# Altium footprint library Connectors.PcbLib: 164 footprints (part 9 of 11)
Each footprint in its own frame and in the unit in brackets; x right, y up, seen from the top. Pads: shape width x height; smd on the part's side, far side on the other; paste and mask are expansions set on the pad; w line width, h text height; cw(c..) or ccw(c..) is an arc to the next point about the centre after c.
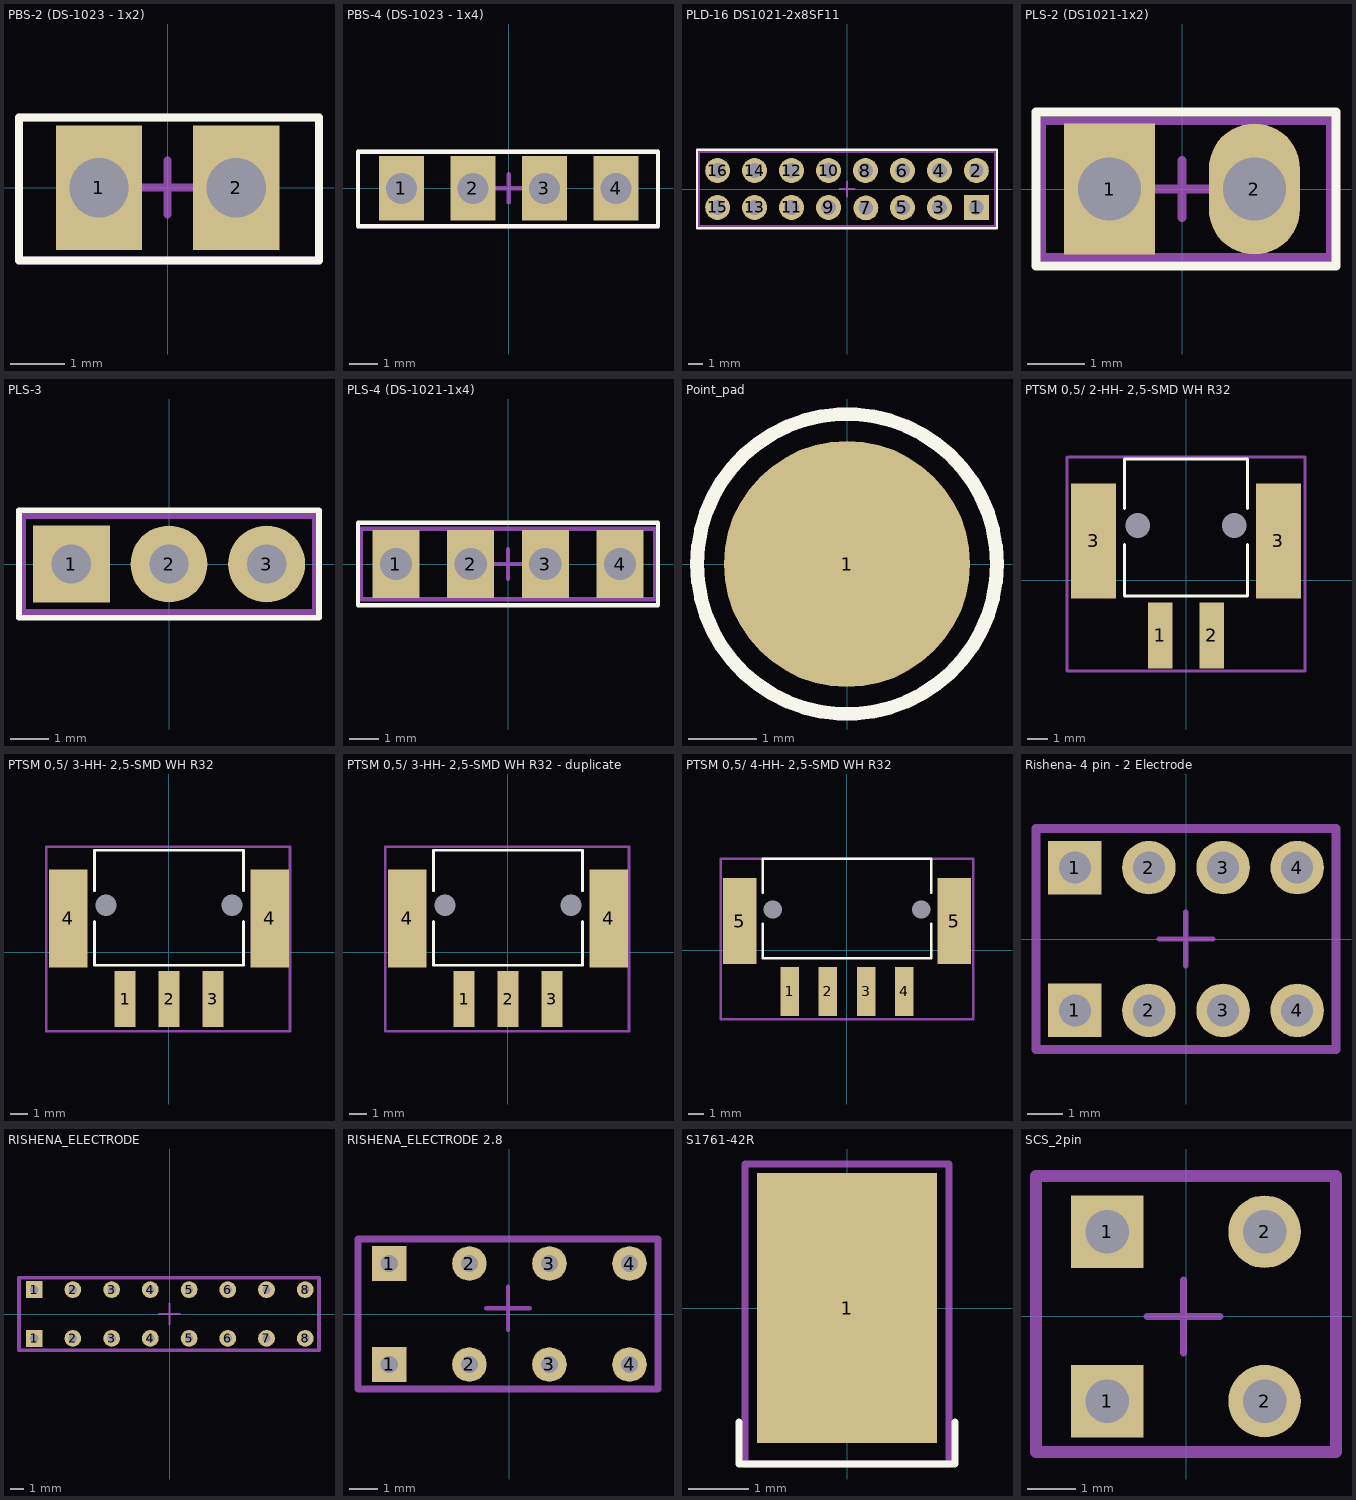
[diagram p8: the footprints below, top view; thin cyan lines are the x and y axes]

## PBS-2 (DS-1023 - 1x2) [mm] "2 point header"
pads (2):
  rect 1.6x2.3 hole 1.1: 1(-1.27,0) 2(1.27,0)
Top Overlay:
  lines w0.15: -2.75,-1.35 -2.75,1.3 2.8,1.3 2.8,-1.35 -2.75,-1.35
Mechanical 13:
  lines w0.15: -0.5,0 0.5,0 ; 0,-0.5 0,0.5 ; -2.75,-1.35 2.8,-1.35 2.8,1.3 -2.75,1.3 -2.75,-1.35
3D body "User Library-PBS_(DS1023)_1line_connectors_h=5_0_8_5mm_step_2_54mm-1 (1).step": height 8.5, standoff -3, extent -2.79,-1.25 2.79,1.25

## PBS-4 (DS-1023 - 1x4) [mm] "4 point header"
pads (4):
  rect 1.6x2.3 hole 1.1: 1(-3.81,0) 2(-1.27,0) 3(1.27,0) 4(3.81,0)
Top Overlay:
  lines w0.15: -5.35,-1.35 -5.35,1.3 5.3,1.3 5.3,-1.35 -5.35,-1.35
Mechanical 13:
  lines w0.15: -0.5,0 0.5,0 ; 0,-0.5 0,0.5 ; -5.35,-1.35 5.3,-1.35 5.3,1.3 -5.35,1.3 -5.35,-1.35
3D body "User Library-PBS_(DS1023)_1line_connectors_h=5_0_8_5mm_step_2_54mm-1.step": height 8.5, standoff -3, extent -5.33,-1.25 5.33,1.25

## PLD-16 DS1021-2x8SF11 [mm]
pads (16):
  rect 1.7x1.7 hole 1: 1(8.89,-1.27)
  round 1.7 hole 1: 2(8.89,1.27) 3(6.35,-1.27) 4(6.35,1.27) 5(3.81,-1.27) 6(3.81,1.27) 7(1.3,-1.3) 8(1.27,1.27) 9(-1.27,-1.27) 10(-1.27,1.27) 11(-3.81,-1.27) 12(-3.81,1.27) 13(-6.35,-1.27) 14(-6.35,1.27) 15(-8.89,-1.27) 16(-8.89,1.27)
Top Overlay:
  lines w0.15: -10.3,-2.7 -10.3,2.7 10.3,2.7 10.3,-2.7 -10.3,-2.7
Mechanical 15:
  lines w0.15: -0.5,0 0.5,0 ; 0,-0.5 0,0.5 ; -10.16,-2.54 10.16,-2.54 10.16,2.54 -10.16,2.54 -10.16,-2.54
3D body "User Library-DS1021_Male.step": height 8.54, standoff -2.96, extent -10.16,-2.55 10.16,2.53

## PLS-2 (DS1021-1x2) [mm] "2 point header"
pads (2):
  rect 1.6x2.3 hole 1.1: 1(-1.27,0)
  oval 1.6x2.3 hole 1.1: 2(1.27,0)
Top Overlay:
  lines w0.15: -2.56,-1.35 2.7,-1.35 2.7,1.35 -2.56,1.35 -2.56,-1.35
Mechanical 13:
  lines w0.15: -0.5,0 0.5,0 ; 0,-0.5 0,0.5 ; -2.46,-1.2 -2.46,1.2 2.6,1.2 2.6,-1.2 -2.46,-1.2
3D body "User Library-PLS-2-1.STEP": height 7.83, standoff -2.97, extent -2.48,-1.27 2.6,1.27

## PLS-3 [mm]
pads (3):
  rect 2x2 hole 1.02 mask+0.07: 1(-2.54,0)
  round 2 hole 1.02 mask+0.07: 2(0,0) 3(2.54,0)
Top Overlay:
  lines w0.15: -3.9,-1.4 -3.9,1.4 3.9,1.4 3.9,-1.4 -3.9,-1.4
Mechanical 15:
  lines w0.15: -0.5,0 0.5,0 ; 0,-0.5 0,0.5 ; -3.79,-1.25 3.79,-1.25 3.79,1.25 -3.79,1.25 -3.79,-1.25
3D body "User Library-PLS-03.step": height 8, standoff -3.3, extent -3.81,-1.25 3.81,1.25

## PLS-4 (DS-1021-1x4) [mm] "4 point header"
pads (4):
  rect 1.6x2.3 hole 1.1: 1(-3.81,0) 2(-1.27,0) 3(1.27,0) 4(3.81,0)
Top Overlay:
  lines w0.15: -5.1,-1.4 5.1,-1.4 5.1,1.4 -5.1,1.4 -5.1,-1.4
Mechanical 13:
  lines w0.15: -0.5,0 0.5,0 ; 0,-0.5 0,0.5 ; -5,-1.2 -5,1.2 5,1.2 5,-1.2 -5,-1.2
3D body "User Library-1x4 TH Pitch 2_54mm.STEP": height 9.2, standoff -3.5, extent -5.08,-1.27 5.08,1.27

## Point_pad [mm]
pads (1):
  round 3.6 smd: 1(0,0)
Top Overlay:
  circle w0.2: c0,0 r2.193
Mechanical 3:
  lines w0.1: -0.5,0 0.5,0 ; 0,-0.5 0,0.5
3D body "s70-332002045.stp": height 0.2, standoff 0, extent -1.6,-1.6 1.6,1.6

## PTSM 0,5/ 2-HH- 2,5-SMD WH R32 [mm]
height 6
pads (6):
  rect 1.2x3.2 smd: 1(-1.25,-2.675) 2(1.25,-2.675)
  rect 2.2x5.6 smd: 3(-4.5,1.925) 3(4.5,1.925)
  round 0 hole 1.2 unplated: NC(-2.35,2.675) NC(2.35,2.675)
Top Overlay:
  lines w0.15: -3,1.75 -3,-0.75 3,-0.75 3,1.75 ; -3,3.5 -3,5.9 3,5.9 3,3.5
Mechanical 15:
  lines w0.15: -5.8,6 -5.8,-4.4 5.8,-4.4 5.8,6 -5.7,6
3D body "1808190.stp": height 5, standoff 0, extent -5.3,-3.6 5.3,5.9

## PTSM 0,5/ 3-HH- 2,5-SMD WH R32 [mm]
height 6
pads (7):
  rect 1.2x3.2 smd: 1(-2.5,-2.675) 2(0,-2.675) 3(2.5,-2.675)
  rect 2.2x5.6 smd: 4(-5.75,1.925) 4(5.75,1.925)
  round 0 hole 1.2 unplated: NC(-3.6,2.675) NC(3.6,2.675)
Top Overlay:
  lines w0.15: -4.25,1.75 -4.25,-0.75 4.25,-0.75 4.25,1.75 ; -4.25,3.5 -4.25,5.8 4.25,5.8 4.25,3.5
Mechanical 15:
  lines w0.15: -7,-4.5 -7,6 6.9,6 6.9,-4.5 -7,-4.5
3D body "1808200.stp": height 5, standoff 0, extent -6.55,-3.6 6.55,5.9

## PTSM 0,5/ 3-HH- 2,5-SMD WH R32 - duplicate [mm]
height 6
pads (7):
  rect 1.2x3.2 smd: 1(-2.5,-2.675) 2(0,-2.675) 3(2.5,-2.675)
  rect 2.2x5.6 smd: 4(-5.75,1.925) 4(5.75,1.925)
  round 0 hole 1.2 unplated: NC(-3.6,2.675) NC(3.6,2.675)
Top Overlay:
  lines w0.15: -4.25,1.75 -4.25,-0.75 4.25,-0.75 4.25,1.75 ; -4.25,3.5 -4.25,5.8 4.25,5.8 4.25,3.5
Mechanical 15:
  lines w0.15: -7,-4.5 -7,6 6.9,6 6.9,-4.5 -7,-4.5
3D body "1808200.stp": height 5, standoff 0, extent -6.55,-3.6 6.55,5.9

## PTSM 0,5/ 4-HH- 2,5-SMD WH R32 [mm]
height 6
pads (8):
  rect 1.2x3.2 smd: 1(-3.75,-2.675) 2(-1.25,-2.675) 3(1.25,-2.675) 4(3.75,-2.675)
  rect 2.2x5.6 smd: 5(-7,1.925) 5(7,1.925)
  round 0 hole 1.2 unplated: NC(-4.85,2.675) NC(4.85,2.675)
Top Overlay:
  lines w0.15: -5.5,1.75 -5.5,-0.5 5.5,-0.5 5.5,1.75 ; -5.5,3.75 -5.5,6 5.5,6 5.5,3.75
Mechanical 15:
  lines w0.15: -8.25,-4.5 -8.25,6 8.25,6 8.25,-4.5 -8.25,-4.5
3D body "1808213.stp": height 5, standoff 0, extent -7.8,-3.6 7.8,5.9

## Rishena- 4 pin - 2 Electrode [mm] "Rishena 4 pin -2 connector implanted  electrode,"
height 5
pads (8):
  rect 1.5x1.5 hole 0.9: 1(-3.112,-2) 1(-3.112,2)
  round 1.5 hole 0.9: 2(-1.037,-2) 2(-1.037,2) 3(1.037,-2) 3(1.037,2) 4(3.112,-2) 4(3.112,2)
Mechanical 15:
  lines w0.15: -0.748,0 0.753,0 ; -0.002,-0.75 -0.002,0.75
  lines w0.254: -4.2,-3.1 4.2,-3.1 4.2,3.1 -4.2,3.1 -4.2,-3.1
3D body "Header.step": height 5.1, standoff 0, extent 2.962,-1.95 3.262,1.95
3D body "Header.step": height 5.1, standoff 0, extent 0.887,-1.95 1.187,1.95
3D body "Header.step": height 5.1, standoff 0, extent -3.262,-1.95 -2.962,1.95
3D body "Header.step": height 5.1, standoff 0, extent -1.188,-1.95 -0.888,1.95

## RISHENA_ELECTRODE [mm] "Rishena  8pin connector implanted  electrode"
height 5
pads (16):
  rect 1.2x1.2 hole 0.6: 1(-9.712,-1.75) 1(-9.712,1.75)
  round 1.2 hole 0.6: 2(-6.937,-1.75) 2(-6.937,1.75) 3(-4.162,-1.75) 3(-4.162,1.75) 4(-1.387,-1.75) 4(-1.387,1.75) 5(1.387,-1.75) 5(1.387,1.75) 6(4.162,-1.75) 6(4.162,1.75) 7(6.937,-1.75) 7(6.937,1.75) 8(9.712,-1.75) 8(9.712,1.75)
Mechanical 15:
  lines w0.15: -0.75,0 0.75,0 ; 0,-0.75 0,0.75
  lines w0.254: -10.8,-2.6 -10.8,2.6 10.7,2.6 10.7,-2.6 -10.8,-2.6
3D body "Header.step": height 4.1, standoff -1, extent -7.096,-1.9 -6.796,2
3D body "Header.step": height 4.1, standoff -1, extent 9.554,-1.9 9.854,2
3D body "Header.step": height 4.1, standoff -1, extent 6.779,-1.9 7.079,2
3D body "Header.step": height 4.1, standoff -1, extent 4.004,-1.9 4.304,2
3D body "Header.step": height 4.1, standoff -1, extent 1.229,-1.9 1.529,2
3D body "Header.step": height 4.1, standoff -1, extent -1.546,-1.9 -1.246,2
3D body "Header.step": height 4.1, standoff -1, extent -4.321,-1.9 -4.021,2
3D body "Header.step": height 4.1, standoff -1, extent -9.862,-1.9 -9.562,2

## RISHENA_ELECTRODE 2.8 [mm] "Rishena  4pin connector implanted  electrode"
height 5
pads (8):
  rect 1.2x1.2 hole 0.6: 1(-4.162,-1.75) 1(-4.162,1.75)
  round 1.2 hole 0.6: 2(-1.387,-1.75) 2(-1.387,1.75) 3(1.388,-1.75) 3(1.388,1.75) 4(4.162,-1.75) 4(4.162,1.75)
Mechanical 15:
  lines w0.15: -0.8,0.2 0.7,0.2 ; -0.05,-0.55 -0.05,0.95
  lines w0.254: -5.25,-2.6 -5.25,2.6 5.15,2.6 5.15,-2.6 -5.25,-2.6
3D body "Header.step": height 4.1, standoff -1, extent -1.546,-1.9 -1.246,2
3D body "Header.step": height 4.1, standoff -1, extent 4.004,-1.9 4.304,2
3D body "Header.step": height 4.1, standoff -1, extent 1.229,-1.9 1.529,2
3D body "Header.step": height 4.1, standoff -1, extent -4.312,-1.9 -4.012,2

## S1761-42R [mm] "3.50mm SMT Spring Contact"
pads (1):
  rect 3x4.5 smd: 1(0,0)
Top Overlay:
  lines w0.11: -1.8,-1.9 -1.8,-2.6 1.8,-2.6 1.8,-1.9
Mechanical 13:
  lines w0.11: -1,0 1,0 ; 0,-1 0,1 ; -1.7,-2.6 -1.7,2.4 1.7,2.4 1.7,-2.6 -1.7,-2.6
3D body "s1761-42r.stp": height 3.51, standoff -0.01, extent -1.25,-2.5 1.25,1.999

## SCS_2pin [mm] "Rishena 302D 8pin connector implanted  electrode"
height 5
pads (4):
  rect 1.5x1.5 hole 0.9: 1(-1.625,-1.75) 1(-1.625,1.75)
  round 1.5 hole 0.9: 2(1.625,-1.75) 2(1.625,1.75)
Mechanical 15:
  lines w0.15: -0.8,0 0.7,0 ; -0.05,-0.75 -0.05,0.75
  lines w0.254: -3.1,-2.8 3.1,-2.8 3.1,2.9 -3.1,2.9 -3.1,-2.8
3D body "Header.step": height 4.1, standoff -1, extent 1.467,-1.9 1.767,2
3D body "Header.step": height 4.1, standoff -1, extent -1.775,-1.9 -1.475,2